# Altium footprint library Test.PcbLib: 245 footprints (part 1 of 17)
Each footprint in its own frame and in the unit in brackets; x right, y up, seen from the top. Pads: shape width x height; smd on the part's side, far side on the other; paste and mask are expansions set on the pad; w line width, h text height; cw(c..) or ccw(c..) is an arc to the next point about the centre after c.
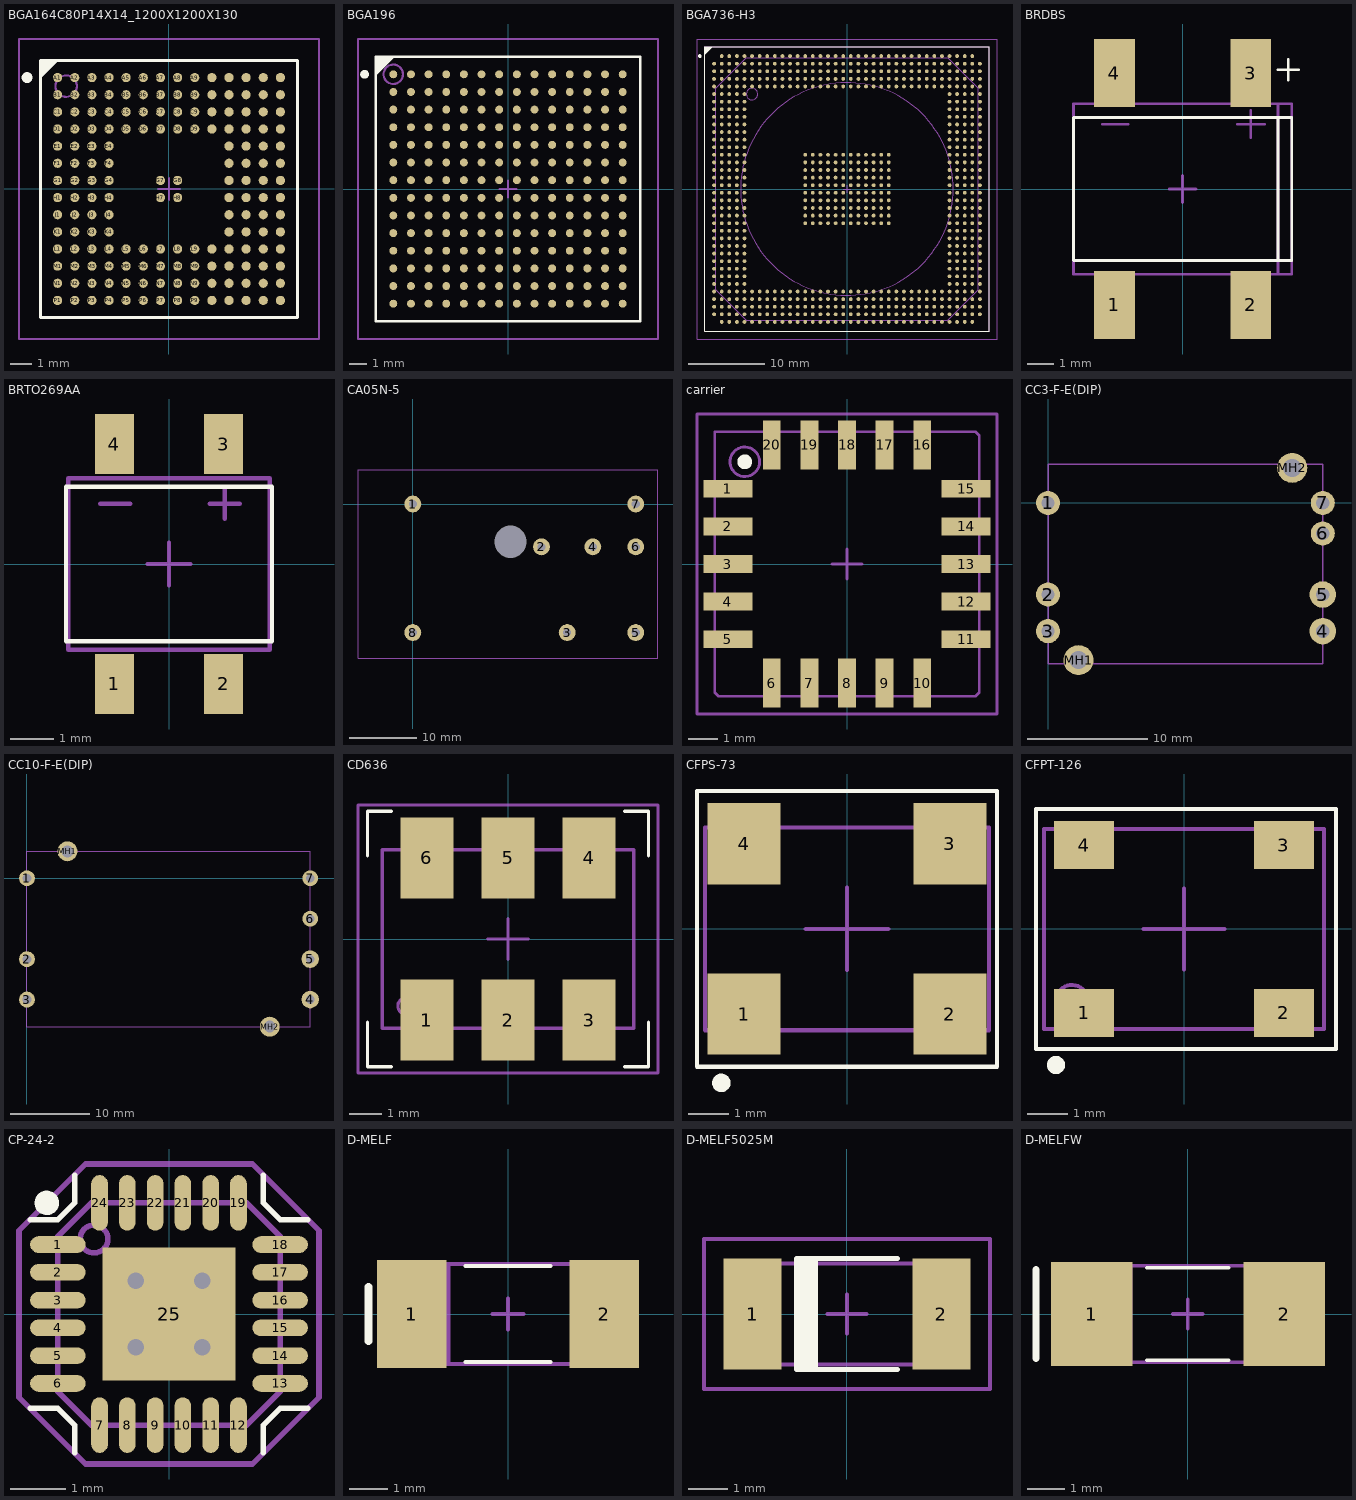
[diagram p0: the footprints below, top view; thin cyan lines are the x and y axes]

## BGA164C80P14X14_1200X1200X130 [mm] "BGA, 164-Leads, Body 12,0x12,0mm,  Pitch 0,80mm"
height 1.3
pads (164):
  round 0.43 smd mask+0.038: A1(-5.2,5.2) A2(-4.4,5.2) A3(-3.6,5.2) A4(-2.8,5.2) A5(-2,5.2) A6(-1.2,5.2) A7(-0.4,5.2) A8(0.4,5.2) A9(1.2,5.2) A10(2,5.2) A11(2.8,5.2) A12(3.6,5.2) A13(4.4,5.2) A14(5.2,5.2) B1(-5.2,4.4) B2(-4.4,4.4) B3(-3.6,4.4) B4(-2.8,4.4) B5(-2,4.4) B6(-1.2,4.4) B7(-0.4,4.4) B8(0.4,4.4) B9(1.2,4.4) B10(2,4.4) B11(2.8,4.4) B12(3.6,4.4) B13(4.4,4.4) B14(5.2,4.4) C1(-5.2,3.6) C2(-4.4,3.6) C3(-3.6,3.6) C4(-2.8,3.6) C5(-2,3.6) C6(-1.2,3.6) C7(-0.4,3.6) C8(0.4,3.6) C9(1.2,3.6) C10(2,3.6) C11(2.8,3.6) C12(3.6,3.6) C13(4.4,3.6) C14(5.2,3.6) D1(-5.2,2.8) D2(-4.4,2.8) D3(-3.6,2.8) D4(-2.8,2.8) D5(-2,2.8) D6(-1.2,2.8) D7(-0.4,2.8) D8(0.4,2.8) D9(1.2,2.8) D10(2,2.8) D11(2.8,2.8) D12(3.6,2.8) D13(4.4,2.8) D14(5.2,2.8) E1(-5.2,2) E2(-4.4,2) E3(-3.6,2) E4(-2.8,2) E11(2.8,2) E12(3.6,2) E13(4.4,2) E14(5.2,2) F1(-5.2,1.2) F2(-4.4,1.2) F3(-3.6,1.2) F4(-2.8,1.2) F11(2.8,1.2) F12(3.6,1.2) F13(4.4,1.2) F14(5.2,1.2) G1(-5.2,0.4) G2(-4.4,0.4) G3(-3.6,0.4) G4(-2.8,0.4) G7(-0.4,0.4) G8(0.4,0.4) G11(2.8,0.4) G12(3.6,0.4) G13(4.4,0.4) G14(5.2,0.4) H1(-5.2,-0.4) H2(-4.4,-0.4) H3(-3.6,-0.4) H4(-2.8,-0.4) H7(-0.4,-0.4) H8(0.4,-0.4) H11(2.8,-0.4) H12(3.6,-0.4) H13(4.4,-0.4) H14(5.2,-0.4) J1(-5.2,-1.2) J2(-4.4,-1.2) J3(-3.6,-1.2) J4(-2.8,-1.2) J11(2.8,-1.2) J12(3.6,-1.2) J13(4.4,-1.2) J14(5.2,-1.2) K1(-5.2,-2) K2(-4.4,-2) K3(-3.6,-2) K4(-2.8,-2) K11(2.8,-2) K12(3.6,-2) K13(4.4,-2) K14(5.2,-2) L1(-5.2,-2.8) L2(-4.4,-2.8) L3(-3.6,-2.8) L4(-2.8,-2.8) L5(-2,-2.8) L6(-1.2,-2.8) L7(-0.4,-2.8) L8(0.4,-2.8) L9(1.2,-2.8) L10(2,-2.8) L11(2.8,-2.8) L12(3.6,-2.8) L13(4.4,-2.8) L14(5.2,-2.8) M1(-5.2,-3.6) M2(-4.4,-3.6) M3(-3.6,-3.6) M4(-2.8,-3.6) M5(-2,-3.6) M6(-1.2,-3.6) M7(-0.4,-3.6) M8(0.4,-3.6) M9(1.2,-3.6) M10(2,-3.6) M11(2.8,-3.6) M12(3.6,-3.6) M13(4.4,-3.6) M14(5.2,-3.6) N1(-5.2,-4.4) N2(-4.4,-4.4) N3(-3.6,-4.4) N4(-2.8,-4.4) N5(-2,-4.4) N6(-1.2,-4.4) N7(-0.4,-4.4) N8(0.4,-4.4) N9(1.2,-4.4) N10(2,-4.4) N11(2.8,-4.4) N12(3.6,-4.4) N13(4.4,-4.4) N14(5.2,-4.4) P1(-5.2,-5.2) P2(-4.4,-5.2) P3(-3.6,-5.2) P4(-2.8,-5.2) P5(-2,-5.2) P6(-1.2,-5.2) P7(-0.4,-5.2) P8(0.4,-5.2) P9(1.2,-5.2) P10(2,-5.2) P11(2.8,-5.2) P12(3.6,-5.2) P13(4.4,-5.2) P14(5.2,-5.2)
Top Overlay:
  circle w0.25: c-6.625,5.2 r0.125
  region: -5.234,6 -6,5.234 -6,6
  lines w0.15: -6,5.234 -5.234,6 ; -6,-6 -6,6 6,6 6,-6 -6,-6
Mechanical 13:
  circle w0.1: c-4.8,4.8 r0.5
  lines w0.1: -6,-6 -6,6 6,6 6,-6 -6,-6
Mechanical 15:
  lines w0.1: -0.5,0 0.5,0 ; 0,-0.5 0,0.5 ; -7,-7 -7,7 7,7 7,-7 -7,-7
3D body: height 1.31, standoff 1.3, extent -5.31,4.29 -4.29,5.31
3D body: height 1.3, standoff 0.28, extent -6,-6 6,6

## BGA196 [mm]
height 1.6
pads (196):
  round 0.45 smd: A1(-6.5,6.5) A2(-5.5,6.5) A3(-4.5,6.5) A4(-3.5,6.5) A5(-2.5,6.5) A6(-1.5,6.5) A7(-0.5,6.5) A8(0.5,6.5) A9(1.5,6.5) A10(2.5,6.5) A11(3.5,6.5) A12(4.5,6.5) A13(5.5,6.5) A14(6.5,6.5) B1(-6.5,5.5) B2(-5.5,5.5) B3(-4.5,5.5) B4(-3.5,5.5) B5(-2.5,5.5) B6(-1.5,5.5) B7(-0.5,5.5) B8(0.5,5.5) B9(1.5,5.5) B10(2.5,5.5) B11(3.5,5.5) B12(4.5,5.5) B13(5.5,5.5) B14(6.5,5.5) C1(-6.5,4.5) C2(-5.5,4.5) C3(-4.5,4.5) C4(-3.5,4.5) C5(-2.5,4.5) C6(-1.5,4.5) C7(-0.5,4.5) C8(0.5,4.5) C9(1.5,4.5) C10(2.5,4.5) C11(3.5,4.5) C12(4.5,4.5) C13(5.5,4.5) C14(6.5,4.5) D1(-6.5,3.5) D2(-5.5,3.5) D3(-4.5,3.5) D4(-3.5,3.5) D5(-2.5,3.5) D6(-1.5,3.5) D7(-0.5,3.5) D8(0.5,3.5) D9(1.5,3.5) D10(2.5,3.5) D11(3.5,3.5) D12(4.5,3.5) D13(5.5,3.5) D14(6.5,3.5) E1(-6.5,2.5) E2(-5.5,2.5) E3(-4.5,2.5) E4(-3.5,2.5) E5(-2.5,2.5) E6(-1.5,2.5) E7(-0.5,2.5) E8(0.5,2.5) E9(1.5,2.5) E10(2.5,2.5) E11(3.5,2.5) E12(4.5,2.5) E13(5.5,2.5) E14(6.5,2.5) F1(-6.5,1.5) F2(-5.5,1.5) F3(-4.5,1.5) F4(-3.5,1.5) F5(-2.5,1.5) F6(-1.5,1.5) F7(-0.5,1.5) F8(0.5,1.5) F9(1.5,1.5) F10(2.5,1.5) F11(3.5,1.5) F12(4.5,1.5) F13(5.5,1.5) F14(6.5,1.5) G1(-6.5,0.5) G2(-5.5,0.5) G3(-4.5,0.5) G4(-3.5,0.5) G5(-2.5,0.5) G6(-1.5,0.5) G7(-0.5,0.5) G8(0.5,0.5) G9(1.5,0.5) G10(2.5,0.5) G11(3.5,0.5) G12(4.5,0.5) G13(5.5,0.5) G14(6.5,0.5) H1(-6.5,-0.5) H2(-5.5,-0.5) H3(-4.5,-0.5) H4(-3.5,-0.5) H5(-2.5,-0.5) H6(-1.5,-0.5) H7(-0.5,-0.5) H8(0.5,-0.5) H9(1.5,-0.5) H10(2.5,-0.5) H11(3.5,-0.5) H12(4.5,-0.5) H13(5.5,-0.5) H14(6.5,-0.5) J1(-6.5,-1.5) J2(-5.5,-1.5) J3(-4.5,-1.5) J4(-3.5,-1.5) J5(-2.5,-1.5) J6(-1.5,-1.5) J7(-0.5,-1.5) J8(0.5,-1.5) J9(1.5,-1.5) J10(2.5,-1.5) J11(3.5,-1.5) J12(4.5,-1.5) J13(5.5,-1.5) J14(6.5,-1.5) K1(-6.5,-2.5) K2(-5.5,-2.5) K3(-4.5,-2.5) K4(-3.5,-2.5) K5(-2.5,-2.5) K6(-1.5,-2.5) K7(-0.5,-2.5) K8(0.5,-2.5) K9(1.5,-2.5) K10(2.5,-2.5) K11(3.5,-2.5) K12(4.5,-2.5) K13(5.5,-2.5) K14(6.5,-2.5) L1(-6.5,-3.5) L2(-5.5,-3.5) L3(-4.5,-3.5) L4(-3.5,-3.5) L5(-2.5,-3.5) L6(-1.5,-3.5) L7(-0.5,-3.5) L8(0.5,-3.5) L9(1.5,-3.5) L10(2.5,-3.5) L11(3.5,-3.5) L12(4.5,-3.5) L13(5.5,-3.5) L14(6.5,-3.5) M1(-6.5,-4.5) M2(-5.5,-4.5) M3(-4.5,-4.5) M4(-3.5,-4.5) M5(-2.5,-4.5) M6(-1.5,-4.5) M7(-0.5,-4.5) M8(0.5,-4.5) M9(1.5,-4.5) M10(2.5,-4.5) M11(3.5,-4.5) M12(4.5,-4.5) M13(5.5,-4.5) M14(6.5,-4.5) N1(-6.5,-5.5) N2(-5.5,-5.5) N3(-4.5,-5.5) N4(-3.5,-5.5) N5(-2.5,-5.5) N6(-1.5,-5.5) N7(-0.5,-5.5) N8(0.5,-5.5) N9(1.5,-5.5) N10(2.5,-5.5) N11(3.5,-5.5) N12(4.5,-5.5) N13(5.5,-5.5) N14(6.5,-5.5) P1(-6.5,-6.5) P2(-5.5,-6.5) P3(-4.5,-6.5) P4(-3.5,-6.5) P5(-2.5,-6.5) P6(-1.5,-6.5) P7(-0.5,-6.5) P8(0.5,-6.5) P9(1.5,-6.5) P10(2.5,-6.5) P11(3.5,-6.5) P12(4.5,-6.5) P13(5.5,-6.5) P14(6.5,-6.5)
Top Overlay:
  circle w0.25: c-8.125,6.5 r0.125
  region: -6.5,7.5 -7.5,6.5 -7.5,7.5
  lines w0.15: -7.5,6.5 -6.5,7.5 ; -7.5,-7.5 7.5,-7.5 7.5,7.5 -7.5,7.5 -7.5,-7.5
Mechanical 13:
  circle w0.127: c-6.5,6.5 r0.55
  lines w0.1: -7.5,-7.5 7.5,-7.5 7.5,7.5 -7.5,7.5 -7.5,-7.5
Mechanical 15:
  lines w0.1: -0.5,0 0.5,0 ; 0,-0.5 0,0.5 ; -8.5,-8.5 8.5,-8.5 8.5,8.5 -8.5,8.5 -8.5,-8.5
3D body: height 1.61, standoff 1.6, extent -7.061,5.939 -5.939,7.061
3D body: height 1.6, standoff 0.4, extent -7.5,-7.5 7.5,7.5

## BGA736-H3 [mm] "PBGA 736pin"
height 2.42
pads (736):
  round 0.5 smd: A2(-16.5,17.5) A3(-15.5,17.5) A4(-14.5,17.5) A5(-13.5,17.5) A6(-12.5,17.5) A7(-11.5,17.5) A8(-10.5,17.5) A9(-9.5,17.5) A10(-8.5,17.5) A11(-7.5,17.5) A12(-6.5,17.5) A13(-5.5,17.5) A14(-4.5,17.5) A15(-3.5,17.5) A16(-2.5,17.5) A17(-1.5,17.5) A18(-0.5,17.5) A19(0.5,17.5) A20(1.5,17.5) A21(2.5,17.5) A22(3.5,17.5) A23(4.5,17.5) A24(5.5,17.5) A25(6.5,17.5) A26(7.5,17.5) A27(8.5,17.5) A28(9.5,17.5) A29(10.5,17.5) A30(11.5,17.5) A31(12.5,17.5) A32(13.5,17.5) A33(14.5,17.5) A34(15.5,17.5) A35(16.5,17.5) AA1(-17.5,-2.5) AA2(-16.5,-2.5) AA3(-15.5,-2.5) AA4(-14.5,-2.5) AA5(-13.5,-2.5) AA13(-5.5,-2.5) AA14(-4.5,-2.5) AA15(-3.5,-2.5) AA16(-2.5,-2.5) AA17(-1.5,-2.5) AA18(-0.5,-2.5) AA19(0.5,-2.5) AA20(1.5,-2.5) AA21(2.5,-2.5) AA22(3.5,-2.5) AA23(4.5,-2.5) AA24(5.5,-2.5) AA32(13.5,-2.5) AA33(14.5,-2.5) AA34(15.5,-2.5) AA35(16.5,-2.5) AA36(17.5,-2.5) AB1(-17.5,-3.5) AB2(-16.5,-3.5) AB3(-15.5,-3.5) AB4(-14.5,-3.5) AB5(-13.5,-3.5) AB13(-5.5,-3.5) AB14(-4.5,-3.5) AB15(-3.5,-3.5) AB16(-2.5,-3.5) AB17(-1.5,-3.5) AB18(-0.5,-3.5) AB19(0.5,-3.5) AB20(1.5,-3.5) AB21(2.5,-3.5) AB22(3.5,-3.5) AB23(4.5,-3.5) AB24(5.5,-3.5) AB32(13.5,-3.5) AB33(14.5,-3.5) AB34(15.5,-3.5) AB35(16.5,-3.5) AB36(17.5,-3.5) AC1(-17.5,-4.5) AC2(-16.5,-4.5) AC3(-15.5,-4.5) AC4(-14.5,-4.5) AC5(-13.5,-4.5) AC13(-5.5,-4.5) AC14(-4.5,-4.5) AC15(-3.5,-4.5) AC16(-2.5,-4.5) AC17(-1.5,-4.5) AC18(-0.5,-4.5) AC19(0.5,-4.5) AC20(1.5,-4.5) AC21(2.5,-4.5) AC22(3.5,-4.5) AC23(4.5,-4.5) AC24(5.5,-4.5) AC32(13.5,-4.5) AC33(14.5,-4.5) AC34(15.5,-4.5) AC35(16.5,-4.5) AC36(17.5,-4.5) AD1(-17.5,-5.5) AD2(-16.5,-5.5) AD3(-15.5,-5.5) AD4(-14.5,-5.5) AD5(-13.5,-5.5) AD32(13.5,-5.5) AD33(14.5,-5.5) AD34(15.5,-5.5) AD35(16.5,-5.5) AD36(17.5,-5.5) AE1(-17.5,-6.5) AE2(-16.5,-6.5) AE3(-15.5,-6.5) AE4(-14.5,-6.5) AE5(-13.5,-6.5) AE32(13.5,-6.5) AE33(14.5,-6.5) AE34(15.5,-6.5) AE35(16.5,-6.5) AE36(17.5,-6.5) AF1(-17.5,-7.5) AF2(-16.5,-7.5) AF3(-15.5,-7.5) AF4(-14.5,-7.5) AF5(-13.5,-7.5) AF32(13.5,-7.5) AF33(14.5,-7.5) AF34(15.5,-7.5) AF35(16.5,-7.5) AF36(17.5,-7.5) AG1(-17.5,-8.5) AG2(-16.5,-8.5) AG3(-15.5,-8.5) AG4(-14.5,-8.5) AG5(-13.5,-8.5) AG32(13.5,-8.5) AG33(14.5,-8.5) AG34(15.5,-8.5) AG35(16.5,-8.5) AG36(17.5,-8.5) AH1(-17.5,-9.5) AH2(-16.5,-9.5) AH3(-15.5,-9.5) AH4(-14.5,-9.5) AH5(-13.5,-9.5) AH32(13.5,-9.5) AH33(14.5,-9.5) AH34(15.5,-9.5) AH35(16.5,-9.5) AH36(17.5,-9.5) AJ1(-17.5,-10.5) AJ2(-16.5,-10.5) AJ3(-15.5,-10.5) AJ4(-14.5,-10.5) AJ5(-13.5,-10.5) AJ32(13.5,-10.5) AJ33(14.5,-10.5) AJ34(15.5,-10.5) AJ35(16.5,-10.5) AJ36(17.5,-10.5) AK1(-17.5,-11.5) AK2(-16.5,-11.5) AK3(-15.5,-11.5) AK4(-14.5,-11.5) AK5(-13.5,-11.5) AK32(13.5,-11.5) AK33(14.5,-11.5) AK34(15.5,-11.5) AK35(16.5,-11.5) AK36(17.5,-11.5) AL1(-17.5,-12.5) AL2(-16.5,-12.5) AL3(-15.5,-12.5) AL4(-14.5,-12.5) AL5(-13.5,-12.5) AL32(13.5,-12.5) AL33(14.5,-12.5) AL34(15.5,-12.5) AL35(16.5,-12.5) AL36(17.5,-12.5) AM1(-17.5,-13.5) AM2(-16.5,-13.5) AM3(-15.5,-13.5) AM4(-14.5,-13.5) AM5(-13.5,-13.5) AM6(-12.5,-13.5) AM7(-11.5,-13.5) AM8(-10.5,-13.5) AM9(-9.5,-13.5) AM10(-8.5,-13.5) AM11(-7.5,-13.5) AM12(-6.5,-13.5) AM13(-5.5,-13.5) AM14(-4.5,-13.5) AM15(-3.5,-13.5) AM16(-2.5,-13.5) AM17(-1.5,-13.5) AM18(-0.5,-13.5) AM19(0.5,-13.5) AM20(1.5,-13.5) AM21(2.5,-13.5) AM22(3.5,-13.5) AM23(4.5,-13.5) AM24(5.5,-13.5) AM25(6.5,-13.5) AM26(7.5,-13.5) AM27(8.5,-13.5) AM28(9.5,-13.5) AM29(10.5,-13.5) AM30(11.5,-13.5) AM31(12.5,-13.5) AM32(13.5,-13.5) AM33(14.5,-13.5) AM34(15.5,-13.5) AM35(16.5,-13.5) AM36(17.5,-13.5) AN1(-17.5,-14.5) AN2(-16.5,-14.5) AN3(-15.5,-14.5) AN4(-14.5,-14.5) AN5(-13.5,-14.5) AN6(-12.5,-14.5) AN7(-11.5,-14.5) AN8(-10.5,-14.5) AN9(-9.5,-14.5) AN10(-8.5,-14.5) AN11(-7.5,-14.5) AN12(-6.5,-14.5) AN13(-5.5,-14.5) AN14(-4.5,-14.5) AN15(-3.5,-14.5) AN16(-2.5,-14.5) AN17(-1.5,-14.5) AN18(-0.5,-14.5) AN19(0.5,-14.5) AN20(1.5,-14.5) AN21(2.5,-14.5) AN22(3.5,-14.5) AN23(4.5,-14.5) AN24(5.5,-14.5) AN25(6.5,-14.5) AN26(7.5,-14.5) AN27(8.5,-14.5) AN28(9.5,-14.5) AN29(10.5,-14.5) AN30(11.5,-14.5) AN31(12.5,-14.5) AN32(13.5,-14.5) AN33(14.5,-14.5) AN34(15.5,-14.5) AN35(16.5,-14.5) AN36(17.5,-14.5) AP1(-17.5,-15.5) AP2(-16.5,-15.5) AP3(-15.5,-15.5) AP4(-14.5,-15.5) AP5(-13.5,-15.5) AP6(-12.5,-15.5) AP7(-11.5,-15.5) AP8(-10.5,-15.5) AP9(-9.5,-15.5) AP10(-8.5,-15.5) AP11(-7.5,-15.5) AP12(-6.5,-15.5) AP13(-5.5,-15.5) AP14(-4.5,-15.5) AP15(-3.5,-15.5) AP16(-2.5,-15.5) AP17(-1.5,-15.5) AP18(-0.5,-15.5) AP19(0.5,-15.5) AP20(1.5,-15.5) AP21(2.5,-15.5) AP22(3.5,-15.5) AP23(4.5,-15.5) AP24(5.5,-15.5) AP25(6.5,-15.5) AP26(7.5,-15.5) AP27(8.5,-15.5) AP28(9.5,-15.5) AP29(10.5,-15.5) AP30(11.5,-15.5) AP31(12.5,-15.5) AP32(13.5,-15.5) AP33(14.5,-15.5) AP34(15.5,-15.5) AP35(16.5,-15.5) AP36(17.5,-15.5) AR1(-17.5,-16.5) AR2(-16.5,-16.5) AR3(-15.5,-16.5) AR4(-14.5,-16.5) AR5(-13.5,-16.5) AR6(-12.5,-16.5) AR7(-11.5,-16.5) AR8(-10.5,-16.5) AR9(-9.5,-16.5) AR10(-8.5,-16.5) AR11(-7.5,-16.5) AR12(-6.5,-16.5) AR13(-5.5,-16.5) AR14(-4.5,-16.5) AR15(-3.5,-16.5) AR16(-2.5,-16.5) AR17(-1.5,-16.5) AR18(-0.5,-16.5) AR19(0.5,-16.5) AR20(1.5,-16.5) AR21(2.5,-16.5) AR22(3.5,-16.5) AR23(4.5,-16.5) AR24(5.5,-16.5) AR25(6.5,-16.5) AR26(7.5,-16.5) AR27(8.5,-16.5) AR28(9.5,-16.5) AR29(10.5,-16.5) AR30(11.5,-16.5) AR31(12.5,-16.5) AR32(13.5,-16.5) AR33(14.5,-16.5) AR34(15.5,-16.5) AR35(16.5,-16.5) AR36(17.5,-16.5) AT2(-16.5,-17.5) AT3(-15.5,-17.5) AT4(-14.5,-17.5) AT5(-13.5,-17.5) AT6(-12.5,-17.5) AT7(-11.5,-17.5) AT8(-10.5,-17.5) AT9(-9.5,-17.5) AT10(-8.5,-17.5) AT11(-7.5,-17.5) AT12(-6.5,-17.5) AT13(-5.5,-17.5) AT14(-4.5,-17.5) AT15(-3.5,-17.5) AT16(-2.5,-17.5) AT17(-1.5,-17.5) AT18(-0.5,-17.5) AT19(0.5,-17.5) AT20(1.5,-17.5) AT21(2.5,-17.5) AT22(3.5,-17.5) AT23(4.5,-17.5) AT24(5.5,-17.5) AT25(6.5,-17.5) AT26(7.5,-17.5) AT27(8.5,-17.5) AT28(9.5,-17.5) AT29(10.5,-17.5) AT30(11.5,-17.5) AT31(12.5,-17.5) AT32(13.5,-17.5) AT33(14.5,-17.5) AT34(15.5,-17.5) AT35(16.5,-17.5) B1(-17.5,16.5) B2(-16.5,16.5) B3(-15.5,16.5) B4(-14.5,16.5) B5(-13.5,16.5) B6(-12.5,16.5) B7(-11.5,16.5) B8(-10.5,16.5) B9(-9.5,16.5) B10(-8.5,16.5) B11(-7.5,16.5) B12(-6.5,16.5) B13(-5.5,16.5) B14(-4.5,16.5) B15(-3.5,16.5) B16(-2.5,16.5) B17(-1.5,16.5) B18(-0.5,16.5) B19(0.5,16.5) B20(1.5,16.5) B21(2.5,16.5) B22(3.5,16.5) B23(4.5,16.5) B24(5.5,16.5) B25(6.5,16.5) B26(7.5,16.5) B27(8.5,16.5) B28(9.5,16.5) B29(10.5,16.5) B30(11.5,16.5) B31(12.5,16.5) B32(13.5,16.5) B33(14.5,16.5) B34(15.5,16.5) B35(16.5,16.5) B36(17.5,16.5) C1(-17.5,15.5) C2(-16.5,15.5) C3(-15.5,15.5) C4(-14.5,15.5) C5(-13.5,15.5) C6(-12.5,15.5) C7(-11.5,15.5) C8(-10.5,15.5) C9(-9.5,15.5) C10(-8.5,15.5) C11(-7.5,15.5) C12(-6.5,15.5) C13(-5.5,15.5) C14(-4.5,15.5) C15(-3.5,15.5) C16(-2.5,15.5) C17(-1.5,15.5) C18(-0.5,15.5) C19(0.5,15.5) C20(1.5,15.5) C21(2.5,15.5) C22(3.5,15.5) C23(4.5,15.5) C24(5.5,15.5) C25(6.5,15.5) C26(7.5,15.5) C27(8.5,15.5) C28(9.5,15.5) C29(10.5,15.5) C30(11.5,15.5) C31(12.5,15.5) C32(13.5,15.5) C33(14.5,15.5) C34(15.5,15.5) C35(16.5,15.5) C36(17.5,15.5) D1(-17.5,14.5) D2(-16.5,14.5) D3(-15.5,14.5) D4(-14.5,14.5) D5(-13.5,14.5) D6(-12.5,14.5) D7(-11.5,14.5) D8(-10.5,14.5) D9(-9.5,14.5) D10(-8.5,14.5) D11(-7.5,14.5) D12(-6.5,14.5) D13(-5.5,14.5) D14(-4.5,14.5) D15(-3.5,14.5) D16(-2.5,14.5) D17(-1.5,14.5) D18(-0.5,14.5) D19(0.5,14.5) D20(1.5,14.5) D21(2.5,14.5) D22(3.5,14.5) D23(4.5,14.5) D24(5.5,14.5) D25(6.5,14.5) D26(7.5,14.5) D27(8.5,14.5) D28(9.5,14.5) D29(10.5,14.5) D30(11.5,14.5) D31(12.5,14.5) D32(13.5,14.5) D33(14.5,14.5) D34(15.5,14.5) D35(16.5,14.5) D36(17.5,14.5) E1(-17.5,13.5) E2(-16.5,13.5) E3(-15.5,13.5) E4(-14.5,13.5) E5(-13.5,13.5) E6(-12.5,13.5) E7(-11.5,13.5) E8(-10.5,13.5) E9(-9.5,13.5) E10(-8.5,13.5) E11(-7.5,13.5) E12(-6.5,13.5) E13(-5.5,13.5) E14(-4.5,13.5) E15(-3.5,13.5) E16(-2.5,13.5) E17(-1.5,13.5) E18(-0.5,13.5) E19(0.5,13.5) E20(1.5,13.5) E21(2.5,13.5) E22(3.5,13.5) E23(4.5,13.5) E24(5.5,13.5) E25(6.5,13.5) E26(7.5,13.5) E27(8.5,13.5) E28(9.5,13.5) E29(10.5,13.5) E30(11.5,13.5) E31(12.5,13.5) E32(13.5,13.5) E33(14.5,13.5) E34(15.5,13.5) E35(16.5,13.5) E36(17.5,13.5) F1(-17.5,12.5) F2(-16.5,12.5) F3(-15.5,12.5) F4(-14.5,12.5) F5(-13.5,12.5) F32(13.5,12.5) F33(14.5,12.5) F34(15.5,12.5) F35(16.5,12.5) F36(17.5,12.5) G1(-17.5,11.5) G2(-16.5,11.5) G3(-15.5,11.5) G4(-14.5,11.5) G5(-13.5,11.5) G32(13.5,11.5) G33(14.5,11.5) G34(15.5,11.5) G35(16.5,11.5) G36(17.5,11.5) H1(-17.5,10.5) H2(-16.5,10.5) H3(-15.5,10.5) H4(-14.5,10.5) H5(-13.5,10.5) H32(13.5,10.5) H33(14.5,10.5) H34(15.5,10.5) H35(16.5,10.5) H36(17.5,10.5) J1(-17.5,9.5) J2(-16.5,9.5) J3(-15.5,9.5) J4(-14.5,9.5) J5(-13.5,9.5) J32(13.5,9.5) J33(14.5,9.5) J34(15.5,9.5) J35(16.5,9.5) J36(17.5,9.5) K1(-17.5,8.5) K2(-16.5,8.5) K3(-15.5,8.5) K4(-14.5,8.5) K5(-13.5,8.5) K32(13.5,8.5) K33(14.5,8.5) K34(15.5,8.5) K35(16.5,8.5) K36(17.5,8.5) L1(-17.5,7.5) L2(-16.5,7.5) L3(-15.5,7.5) L4(-14.5,7.5) L5(-13.5,7.5) L32(13.5,7.5) L33(14.5,7.5) L34(15.5,7.5) L35(16.5,7.5) L36(17.5,7.5) M1(-17.5,6.5) M2(-16.5,6.5) M3(-15.5,6.5) M4(-14.5,6.5) M5(-13.5,6.5) M32(13.5,6.5) M33(14.5,6.5) M34(15.5,6.5) M35(16.5,6.5) M36(17.5,6.5) N1(-17.5,5.5) N2(-16.5,5.5) N3(-15.5,5.5) N4(-14.5,5.5) N5(-13.5,5.5) N32(13.5,5.5) N33(14.5,5.5) N34(15.5,5.5) N35(16.5,5.5) N36(17.5,5.5) P1(-17.5,4.5) P2(-16.5,4.5) P3(-15.5,4.5) P4(-14.5,4.5) P5(-13.5,4.5) P13(-5.5,4.5) P14(-4.5,4.5) P15(-3.5,4.5) P16(-2.5,4.5) P17(-1.5,4.5) P18(-0.5,4.5) P19(0.5,4.5) P20(1.5,4.5) P21(2.5,4.5) P22(3.5,4.5) P23(4.5,4.5) P24(5.5,4.5) P32(13.5,4.5) P33(14.5,4.5) P34(15.5,4.5) P35(16.5,4.5) P36(17.5,4.5) R1(-17.5,3.5) R2(-16.5,3.5) R3(-15.5,3.5) R4(-14.5,3.5) R5(-13.5,3.5) R13(-5.5,3.5) R14(-4.5,3.5) R15(-3.5,3.5) R16(-2.5,3.5) R17(-1.5,3.5) R18(-0.5,3.5) R19(0.5,3.5) R20(1.5,3.5) R21(2.5,3.5) R22(3.5,3.5) R23(4.5,3.5) R24(5.5,3.5) R32(13.5,3.5) R33(14.5,3.5) R34(15.5,3.5) R35(16.5,3.5) R36(17.5,3.5) T1(-17.5,2.5) T2(-16.5,2.5) T3(-15.5,2.5) T4(-14.5,2.5) T5(-13.5,2.5) T13(-5.5,2.5) T14(-4.5,2.5) T15(-3.5,2.5) T16(-2.5,2.5) T17(-1.5,2.5) T18(-0.5,2.5) T19(0.5,2.5) T20(1.5,2.5) T21(2.5,2.5) T22(3.5,2.5) T23(4.5,2.5) T24(5.5,2.5) T32(13.5,2.5) T33(14.5,2.5) T34(15.5,2.5) T35(16.5,2.5) T36(17.5,2.5) U1(-17.5,1.5) U2(-16.5,1.5) U3(-15.5,1.5) U4(-14.5,1.5) U5(-13.5,1.5) U13(-5.5,1.5) U14(-4.5,1.5) U15(-3.5,1.5) U16(-2.5,1.5) U17(-1.5,1.5) U18(-0.5,1.5) U19(0.5,1.5) U20(1.5,1.5) U21(2.5,1.5) U22(3.5,1.5) U23(4.5,1.5) U24(5.5,1.5) U32(13.5,1.5) U33(14.5,1.5) U34(15.5,1.5) U35(16.5,1.5) U36(17.5,1.5) V1(-17.5,0.5) V2(-16.5,0.5) V3(-15.5,0.5) V4(-14.5,0.5) V5(-13.5,0.5) V13(-5.5,0.5) V14(-4.5,0.5) V15(-3.5,0.5) V16(-2.5,0.5) V17(-1.5,0.5) V18(-0.5,0.5) V19(0.5,0.5) V20(1.5,0.5) V21(2.5,0.5) V22(3.5,0.5) V23(4.5,0.5) V24(5.5,0.5) V32(13.5,0.5) V33(14.5,0.5) V34(15.5,0.5) V35(16.5,0.5) V36(17.5,0.5) W1(-17.5,-0.5) W2(-16.5,-0.5) W3(-15.5,-0.5) W4(-14.5,-0.5) W5(-13.5,-0.5) W13(-5.5,-0.5) W14(-4.5,-0.5) W15(-3.5,-0.5) W16(-2.5,-0.5) W17(-1.5,-0.5) W18(-0.5,-0.5) W19(0.5,-0.5) W20(1.5,-0.5) W21(2.5,-0.5) W22(3.5,-0.5) W23(4.5,-0.5) W24(5.5,-0.5) W32(13.5,-0.5) W33(14.5,-0.5) W34(15.5,-0.5) W35(16.5,-0.5) W36(17.5,-0.5) Y1(-17.5,-1.5) Y2(-16.5,-1.5) Y3(-15.5,-1.5) Y4(-14.5,-1.5) Y5(-13.5,-1.5) Y13(-5.5,-1.5) Y14(-4.5,-1.5) Y15(-3.5,-1.5) Y16(-2.5,-1.5) Y17(-1.5,-1.5) Y18(-0.5,-1.5) Y19(0.5,-1.5) Y20(1.5,-1.5) Y21(2.5,-1.5) Y22(3.5,-1.5) Y23(4.5,-1.5) Y24(5.5,-1.5) Y32(13.5,-1.5) Y33(14.5,-1.5) Y34(15.5,-1.5) Y35(16.5,-1.5) Y36(17.5,-1.5)
Top Overlay:
  circle w0.25: c-19.375,17.5 r0.125
  region: -17.75,18.75 -18.75,17.75 -18.75,18.75
  lines w0.15: -18.75,17.75 -17.75,18.75 ; -18.75,-18.75 -18.75,18.75 18.75,18.75 18.75,-18.75 -18.75,-18.75
Mechanical 13:
  circle w0.127: c0,0 r14
  circle w0.127: c-12.5,12.5 r0.75
  lines w0.1: -18.75,-18.75 -18.75,18.75 18.75,18.75 18.75,-18.75 -18.75,-18.75
  lines w0.102: -17.25,-13.25 -13.25,-17.25 13.25,-17.25 17.25,-13.25 17.25,13.25 13.25,17.25 -13.25,17.25 -17.25,13.25 -17.25,-13.25
Mechanical 15:
  lines w0.1: -0.5,0 0.5,0 ; 0,-0.5 0,0.5 ; -19.75,-19.75 -19.75,19.75 19.75,19.75 19.75,-19.75 -19.75,-19.75
3D body: height 2.42, standoff 2.42, extent -14,-14 14,14
3D body: height 1, standoff 0.4, extent -18.75,-18.75 18.75,18.75
3D body: height 2.42, standoff 1, extent -17.25,-17.25 17.25,17.25
3D body: height 2.42, standoff 2.42, extent -13.256,11.744 -11.744,13.256

## BRDBS [mil] "Bridge rectifier DBS"
height 125
pads (4):
  rect 60x100 smd: 1(-100,-170) 2(100,-170) 3(100,170) 4(-100,170)
Top Overlay:
  lines w4: 140,-105 140,105 ; 140,175 170,175 ; 155,160 155,190 ; -160,-105 -160,105 160,105 160,-105 -160,-105
Mechanical 13:
  lines w4: -120,-125 -120,-200 -80,-200 -80,-125 ; -120,125 -120,200 -80,200 -80,125 ; -117.56,95 -80,95 ; 80,-125 80,-200 120,-200 120,-125 ; 80,95.12 120,95.12 ; 80,125 80,200 120,200 120,125 ; 100,75 100,115 ; 140,-125 140,125 ; -160,-125 -160,125 160,125 160,-125 -160,-125
Mechanical 15:
  lines w4: -19.68,0 19.68,0 ; 0,-19.68 0,19.68
3D body: height 66.93, standoff 55.12, extent -120,-165 -80,-125
3D body: height 11.81, standoff 0, extent -120,-200 -80,-150
3D body: height 55.12, standoff 11.81, extent -120,-165 -80,-150
3D body: height 66.93, standoff 55.12, extent 80,-165 120,-125
3D body: height 11.81, standoff 0, extent 80,-200 120,-150
3D body: height 55.12, standoff 11.81, extent 80,-165 120,-150
3D body: height 66.93, standoff 55.12, extent 80,125 120,165
3D body: height 11.81, standoff 0, extent 80,150 120,200
3D body: height 55.12, standoff 11.81, extent 80,150 120,165
3D body: height 55.12, standoff 11.81, extent -120,150 -80,165
3D body: height 11.81, standoff 0, extent -120,150 -80,200
3D body: height 66.93, standoff 55.12, extent -120,125 -80,165
3D body: height 118.11, standoff 11.81, extent -160,-125 160,125

## BRTO269AA [mm] "Bridge rectifier MBS"
height 2
pads (4):
  rect 0.9x1.4 smd: 1(-1.27,-2.794) 2(1.27,-2.794) 3(1.27,2.794) 4(-1.27,2.794)
Top Overlay:
  lines w0.102: -2.4,-1.8 2.4,-1.8 2.4,1.8 -2.4,1.8 -2.4,-1.8
Mechanical 13:
  lines w0.102: -1.6,1.4 -0.9,1.4 ; 0.95,1.4 1.65,1.4 ; 1.3,1.05 1.3,1.75 ; -2.35,-2 2.35,-2 2.35,2 -2.35,2 -2.35,-2
Mechanical 15:
  lines w0.102: -0.5,0 0.5,0 ; 0,-0.5 0,0.5

## CA05N-5 [mm]
height 12.7
pads (9):
  round 2.5 hole 1.2: 1(0,0) 2(19.05,-6.35) 3(22.86,-19.05) 4(26.67,-6.35) 5(33.02,-19.05) 6(33.02,-6.35) 7(33.02,0) 8(0,-19.05)
  round 0 hole 4.75: MH1(14.48,-5.59)
Mechanical 13:
  lines w0.127: -8.13,-22.86 36.32,-22.86 36.32,5.08 -8.13,5.08 -8.13,-22.86
3D body: height 0, standoff -5.08, extent 32.41,-0.61 33.606,0.588
3D body: height 0, standoff -5.08, extent 32.41,-6.96 33.606,-5.762
3D body: height 0, standoff -5.08, extent 26.06,-6.96 27.256,-5.762
3D body: height 0, standoff -5.08, extent 32.41,-19.66 33.606,-18.462
3D body: height 0, standoff -5.08, extent 18.44,-6.96 19.636,-5.762
3D body: height 0, standoff -5.08, extent 22.25,-19.66 23.446,-18.462
3D body: height 0, standoff -5.08, extent -0.61,-19.66 0.586,-18.462
3D body: height 0, standoff -5.08, extent -0.61,-0.61 0.586,0.588
3D body: height 12.71, standoff 12.7, extent -5.568,0.254 -3.576,2.25
3D body: height 12.7, standoff 0, extent -8.13,-22.86 36.32,5.08

## carrier [mm] "20 Leads; Body Width 8.9mm; Pitch 1.27 mm"
height 1.651
pads (20):
  rect 1.651x0.6 smd: 1(-4.025,2.54) 2(-4.025,1.27) 3(-4.025,0) 4(-4.025,-1.27) 5(-4.025,-2.54) 11(4.025,-2.54) 12(4.025,-1.27) 13(4.025,0) 14(4.025,1.27) 15(4.025,2.54)
  rect 0.6x1.651 smd: 6(-2.54,-4.025) 7(-1.27,-4.025) 8(0,-4.025) 9(1.27,-4.025) 10(2.54,-4.025) 16(2.54,4.025) 17(1.27,4.025) 18(0,4.025) 19(-1.27,4.025) 20(-2.54,4.025)
Top Overlay:
  circle w0.25: c-3.454,3.454 r0.125
Mechanical 13:
  circle w0.1: c-3.454,3.454 r0.5
  lines w0.1: -4.47,-4.343 -4.47,4.47 4.343,4.47 4.47,4.343 4.47,-4.343 4.343,-4.47 -4.343,-4.47 -4.47,-4.343
Mechanical 15:
  lines w0.1: -0.5,0 0.5,0 ; 0,-0.5 0,0.5 ; -5.07,-5.07 -5.07,5.07 5.07,5.07 5.07,-5.07 -5.07,-5.07
3D body: height 1.65, standoff 0, extent -4.445,-4.445 4.445,4.445

## CC3-F-E(DIP) [mm] "CC3-F-E, DIP 11pin, Body 22.86x16.6x8.5mm (LxWxH), R2.54mm"
height 8.5
pads (9):
  round 2 hole 1.1: 1(0,0) 2(0,-7.62) 3(0,-10.668) 6(22.86,-2.54) 7(22.86,0)
  round 2.2 hole 1.1: 4(22.86,-10.668) 5(22.86,-7.62)
  round 2.5 hole 1.5: MH1(2.54,-13.08) MH2(20.32,2.92)
Mechanical 13:
  lines w0.127: 0,-13.38 22.86,-13.38 22.86,3.22 0,3.22 0,-13.38
3D body: height 8.5, standoff 0, extent 0,-13.38 22.86,3.22
3D body: height 3.5, standoff -3.5, extent -0.254,-0.508 0.254,0.508
3D body: height 3.5, standoff -3.5, extent -0.254,-8.128 0.254,-7.112
3D body: height 3.5, standoff -3.5, extent -0.254,-11.176 0.254,-10.16
3D body: height 3.5, standoff -3.5, extent 1.778,-13.589 3.302,-13.081
3D body: height 3.5, standoff -3.5, extent 22.606,-11.176 23.114,-10.16
3D body: height 3.5, standoff -3.5, extent 22.606,-8.128 23.114,-7.112
3D body: height 3.5, standoff -3.5, extent 22.606,-3.048 23.114,-2.032
3D body: height 3.5, standoff -3.5, extent 22.606,-0.508 23.114,0.508
3D body: height 3.5, standoff -3.5, extent 19.558,2.667 21.082,3.175
3D body: height 8.51, standoff 8.5, extent 1.544,-1.016 3.536,0.98

## CC10-F-E(DIP) [mm] "CC3-F-E, DIP 11pin, Body 35.56x22.6x8.5mm (LxWxH), R5.08mm"
height 8.5
pads (9):
  round 2 hole 1.1: 1(0,0) 2(0,-10.16) 3(0,-15.24) 6(35.56,-5.08) 7(35.56,0)
  round 2.2 hole 1.1: 4(35.56,-15.24) 5(35.56,-10.16)
  round 2.5 hole 1.5: MH1(5.08,3.38) MH2(30.48,-18.64)
Mechanical 13:
  lines w0.127: 0,-18.64 35.56,-18.64 ; 0,-18.62 0,3.38 35.56,3.38 35.56,-18.62
3D body: height 8.51, standoff 8.5, extent 1.544,-1.016 3.536,0.98
3D body: height 3.5, standoff -3.5, extent 29.743,-19.148 31.267,-18.64
3D body: height 3.5, standoff -3.5, extent 35.56,-0.533 36.068,0.483
3D body: height 3.5, standoff -3.5, extent 35.56,-5.639 36.068,-4.623
3D body: height 3.5, standoff -3.5, extent 35.56,-10.668 36.068,-9.652
3D body: height 3.5, standoff -3.5, extent 35.56,-15.748 36.068,-14.732
3D body: height 3.5, standoff -3.5, extent 4.318,3.38 5.842,3.888
3D body: height 3.5, standoff -3.5, extent -0.254,-15.748 0.254,-14.732
3D body: height 3.5, standoff -3.5, extent -0.254,-10.668 0.254,-9.652
3D body: height 3.5, standoff -3.5, extent -0.254,-0.508 0.254,0.508
3D body: height 8.5, standoff 0, extent 0,-18.64 35.56,3.38

## CD636 [mm] "X3 Frequency Multiplier 6 pin R2.54mm"
height 4.11
pads (6):
  rect 1.65x2.54 smd: 1(-2.54,-2.54) 2(0,-2.54) 3(2.54,-2.54) 4(2.54,2.54) 5(0,2.54) 6(-2.54,2.54)
Top Overlay:
  lines w0.102: -4.4,-2.6 -4.4,-4 -3.65,-4 ; -4.4,2.6 -4.4,4 -3.65,4 ; 3.65,-4 4.4,-4 4.4,-2.6 ; 3.65,4 4.4,4 4.4,2.6
Mechanical 13:
  lines w0.102: -2.95,-2.1 cw(c-3.2,-2.1) -2.95,-2.097 ; -3.937,-2.794 3.937,-2.794 3.937,2.794 -3.937,2.794 -3.937,-2.794
Mechanical 15:
  lines w0.102: -0.635,0 0.635,0 ; 0,-0.635 0,0.635 ; -4.7,-4.2 -4.7,4.2 4.7,4.2 4.7,-4.2 -4.7,-4.2
3D body: height 4.11, standoff 0, extent -3.937,-2.794 3.937,2.794
3D body: height 4.14, standoff 4.11, extent -3.454,-2.354 -2.945,-1.836

## CFPS-73 [mm] "Ceramic oscillator 7x5x1.8mm SMD"
height 1.8
pads (4):
  rect 1.8x2 smd: 1(-2.54,-2.1) 2(2.54,-2.1) 3(2.54,2.1) 4(-2.54,2.1)
Top Overlay:
  circle w0.254: c-3.1,-3.8 r0.1
  lines w0.102: -3.7,-3.4 3.7,-3.4 3.7,3.4 -3.7,3.4 -3.7,-3.4
Mechanical 13:
  circle w0.1: c-2.8,-1.8 r0.4
  lines w0.102: -3.5,-2.5 -3.5,2.5 3.5,2.5 3.5,-2.5 -3.5,-2.5
Mechanical 15:
  lines w0.102: -1.016,0 1.016,0 ; 0,-1.016 0,1.016
3D body: height 1.8, standoff 0, extent -3.5,-2.5 3.5,2.5
3D body: height 1.81, standoff 1.8, extent -3.208,-2.208 -2.392,-1.392

## CFPT-126 [mm] "Ceramic oscillator 7x5x2mm SMD"
height 2
pads (4):
  rect 1.5x1.2 smd: 1(-2.5,-2.1) 2(2.5,-2.1) 3(2.5,2.1) 4(-2.5,2.1)
Top Overlay:
  circle w0.254: c-3.2,-3.4 r0.1
  lines w0.102: -3.7,-3 3.8,-3 3.8,3 -3.7,3 -3.7,-3
Mechanical 13:
  circle w0.1: c-2.8,-1.8 r0.4
  lines w0.102: -3.5,-2.5 -3.5,2.5 3.5,2.5 3.5,-2.5 -3.5,-2.5
Mechanical 15:
  lines w0.102: -1.016,0 1.016,0 ; 0,-1.016 0,1.016
3D body: height 2.01, standoff 2, extent -3.208,-2.208 -2.392,-1.392
3D body: height 2, standoff 0, extent -3.5,-2.5 3.5,2.5

## CP-24-2 [mm] "24pin LFCSP_VQ Waffle pack"
height 1.016
pads (25):
  oval 1x0.3 smd mask+0.025: 1(-2,1.25) 2(-2,0.75) 3(-2,0.25) 4(-2,-0.25) 5(-2,-0.75) 6(-2,-1.25) 13(2,-1.25) 14(2,-0.75) 15(2,-0.25) 16(2,0.25) 17(2,0.75) 18(2,1.25)
  oval 0.3x1 smd mask+0.025: 7(-1.25,-2) 8(-0.75,-2) 9(-0.25,-2) 10(0.25,-2) 11(0.75,-2) 12(1.25,-2) 19(1.25,2) 20(0.75,2) 21(0.25,2) 22(-0.25,2) 23(-0.75,2) 24(-1.25,2)
  rect 2.4x2.4 smd paste-5 mask-5: 25(0,0)
via 0.6,-0.6 diameter 0.65 hole 0.3
via 0.6,0.6 diameter 0.65 hole 0.3
via -0.6,0.6 diameter 0.65 hole 0.3
via -0.6,-0.6 diameter 0.65 hole 0.3
Top Overlay:
  circle w0.1: c-2.2,2 r0.17
  circle w0.15: c-2.2,2 r0.06
  lines w0.1: -2.5,-1.7 -2,-1.7 -1.7,-2 -1.7,-2.5 ; -2.5,1.7 -2,1.7 -1.7,2 -1.7,2.5 ; 1.7,-2.5 1.7,-2 2,-1.7 2.5,-1.7 ; 1.7,2.5 1.7,2 2,1.7 2.5,1.7
Top Paste:
  region: -0.45,-1.2 -0.45,-0.95 -0.25,-0.75 0.25,-0.75 0.45,-0.95 0.45,-1.2
  region: 1.2,-0.45 0.95,-0.45 0.75,-0.25 0.75,0.25 0.95,0.45 1.2,0.45
  region: 1.2,0.725 0.975,0.725 0.75,0.95 0.75,1.2 0.975,1.2 1.2,1.2
  region: 0.725,-1.2 0.725,-0.975 0.95,-0.75 1.2,-0.75 1.2,-0.975 1.2,-1.2
  region: -1.2,-0.725 -0.975,-0.725 -0.75,-0.95 -0.75,-1.2 -0.975,-1.2 -1.2,-1.2
  region: -0.725,1.2 -0.725,0.975 -0.95,0.75 -1.2,0.75 -1.2,0.975 -1.2,1.2
  region: -0.25,0.45 -0.45,0.25 -0.45,-0.25 -0.25,-0.45 0.25,-0.45 0.45,-0.25 0.45,0.25 0.25,0.45
  region: -0.45,1.2 -0.45,0.95 -0.25,0.75 0.25,0.75 0.45,0.95 0.45,1.2
  region: -1.2,-0.45 -0.95,-0.45 -0.75,-0.25 -0.75,0.25 -0.95,0.45 -1.2,0.45
Top Solder:
  region: 1.25,1.25 0.6,1.25 0.6,0.906 0.717,0.883 0.816,0.816 0.883,0.717 0.906,0.6 0.883,0.483 0.816,0.384 0.717,0.317 0.6,0.294 0.6,0.3 0.6,0.294 0.483,0.317 0.384,0.384 0.317,0.483 0.294,0.6 0.3,0.6 0.294,0.6 0.317,0.717 0.384,0.816 0.483,0.883 0.6,0.906 0.6,0.9 0.6,1.25 0,1.25 0,0 1.25,0
  region: 1.25,-1.25 0.6,-1.25 0.6,-0.906 0.717,-0.883 0.816,-0.816 0.883,-0.717 0.906,-0.6 0.883,-0.483 0.816,-0.384 0.717,-0.317 0.6,-0.294 0.6,-0.3 0.6,-0.294 0.483,-0.317 0.384,-0.384 0.317,-0.483 0.294,-0.6 0.3,-0.6 0.294,-0.6 0.317,-0.717 0.384,-0.816 0.483,-0.883 0.6,-0.906 0.6,-0.9 0.6,-1.25 0,-1.25 0,0 1.25,0
  region: -1.25,-1.25 -0.6,-1.25 -0.6,-0.906 -0.717,-0.883 -0.816,-0.816 -0.883,-0.717 -0.906,-0.6 -0.883,-0.483 -0.816,-0.384 -0.717,-0.317 -0.6,-0.294 -0.6,-0.3 -0.6,-0.294 -0.483,-0.317 -0.384,-0.384 -0.317,-0.483 -0.294,-0.6 -0.3,-0.6 -0.294,-0.6 -0.317,-0.717 -0.384,-0.816 -0.483,-0.883 -0.6,-0.906 -0.6,-0.9 -0.6,-1.25 0,-1.25 0,0 -1.25,0
  region: -1.25,1.25 -0.6,1.25 -0.6,0.906 -0.717,0.883 -0.816,0.816 -0.883,0.717 -0.906,0.6 -0.883,0.483 -0.816,0.384 -0.717,0.317 -0.6,0.294 -0.6,0.3 -0.6,0.294 -0.483,0.317 -0.384,0.384 -0.317,0.483 -0.294,0.6 -0.3,0.6 -0.294,0.6 -0.317,0.717 -0.384,0.816 -0.483,0.883 -0.6,0.906 -0.6,0.9 -0.6,1.25 0,1.25 0,0 -1.25,0
Mechanical 13:
  circle w0.1: c-1.35,1.35 r0.25
  lines w0.1: -2,-1.4 -1.4,-2 1.4,-2 2,-1.4 2,1.4 1.4,2 1.1,2 -1.4,2 -2,1.4 -2,-1.4
Mechanical 15:
  lines w0.1: -0.4,0 0.4,0 ; 0,-0.4 0,0.4 ; -2.7,-1.5 -2.7,1.5 -1.5,2.7 1.5,2.7 2.7,1.5 2.7,-1.5 1.5,-2.7 -1.5,-2.7 -2.7,-1.5
3D body: height 1.01, standoff 0.99, extent -1.648,1.051 -1.05,1.649
3D body: height 1, standoff 0, extent -2,-2 2,2

## D-MELF [mm] "Diode MELF glass"
height 2.5
pads (2):
  rect 1.8x2.8 smd: 1(-2.5,0) 2(2.5,0)
Top Overlay:
  lines w0.102: -1.1,-1.25 1.1,-1.25 ; -1.1,1.25 1.1,1.25
  lines w0.2: -3.625,-0.7 -3.625,0.7
Mechanical 13:
  lines w0.102: -2.05,-1.25 -2.05,1.25 ; -1.95,-1.25 -1.95,1.25 ; -1.85,-1.25 -1.85,1.25 ; -1.75,-1.25 -1.75,1.25 ; -1.65,-1.25 -1.65,1.25 ; -1.55,-1.25 -1.55,1.25 ; -2.5,-1.3 2.5,-1.3 2.5,1.3 -2.5,1.3 -2.5,-0.7 -2.5,-1.3
Mechanical 15:
  lines w0.102: -0.4,0 0.4,0 ; 0,-0.4 0,0.4
3D body: height 1.6, standoff 0, extent -2.5,-1.3 2.5,1.3

## D-MELF5025M [mm] "MELF Diode, 2-Leads, Body 5,0x2,5mm, IPC Low Density"
height 2.6
pads (2):
  rect 1.5x2.85 smd: 1(-2.425,0) 2(2.425,0)
Top Overlay:
  rectangle: -1.3,-1.425 -0.75,1.425
  lines w0.127: 1.3,-1.425 -1.3,-1.425 -1.3,1.425 1.3,1.425
Mechanical 13:
  rectangle: -2.55,-1.3 -1.864,1.3
  lines w0.1: -2.55,-1.3 2.55,-1.3 2.55,1.3 -2.55,1.3 -2.55,-1.3
Mechanical 15:
  lines w0.1: -0.5,0 0.5,0 ; 0,-0.5 0,0.5 ; -3.675,-1.925 3.675,-1.925 3.675,1.925 -3.675,1.925 -3.675,-1.925
3D body: height 2.6, standoff 0, extent -2.55,-1.3 2.55,1.3

## D-MELFW [mm] "Diode MELF glass wave solder"
height 2.5
pads (2):
  rect 2.2x2.8 smd: 1(-2.6,0) 2(2.6,0)
Top Overlay:
  lines w0.102: -1.1,-1.25 1.1,-1.25 ; -1.1,1.25 1.1,1.25
  lines w0.2: -4.1,-1.2 -4.1,1.2
Mechanical 13:
  lines w0.102: -2.05,-1.25 -2.05,1.25 ; -1.95,-1.25 -1.95,1.25 ; -1.85,-1.25 -1.85,1.25 ; -1.75,-1.25 -1.75,1.25 ; -1.65,-1.25 -1.65,1.25 ; -1.55,-1.25 -1.55,1.25 ; -2.5,-1.3 2.5,-1.3 2.5,1.3 -2.5,1.3 -2.5,-0.7 -2.5,-1.3
Mechanical 15:
  lines w0.102: -0.4,0 0.4,0 ; 0,-0.4 0,0.4
3D body: height 2.7, standoff 0.1, extent -2.5,-1.295 -1.95,1.295
3D body: height 2.7, standoff 0.1, extent 1.95,-1.295 2.5,1.295
3D body: height 2.7, standoff 0.1, extent -1.95,-1.3 1.95,1.29
3D body: height 2.72, standoff 0.08, extent -1.6,-1.315 -1,1.315